# Altium footprint library Active.PcbLib: 325 footprints (part 1 of 23) (continued)
## BGA736-H3 [mm] "PBGA 736pin" (continued)
Top Overlay:
  circle w0.25: c-19.375,17.5 r0.125
  region: -17.75,18.75 -18.75,17.75 -18.75,18.75
  lines w0.15: -18.75,17.75 -17.75,18.75 ; -18.75,-18.75 -18.75,18.75 18.75,18.75 18.75,-18.75 -18.75,-18.75
Mechanical 13:
  circle w0.127: c0,0 r14
  circle w0.127: c-12.5,12.5 r0.75
  lines w0.1: -18.75,-18.75 -18.75,18.75 18.75,18.75 18.75,-18.75 -18.75,-18.75
  lines w0.102: -17.25,-13.25 -13.25,-17.25 13.25,-17.25 17.25,-13.25 17.25,13.25 13.25,17.25 -13.25,17.25 -17.25,13.25 -17.25,-13.25
Mechanical 15:
  lines w0.1: -0.5,0 0.5,0 ; 0,-0.5 0,0.5 ; -19.75,-19.75 -19.75,19.75 19.75,19.75 19.75,-19.75 -19.75,-19.75
3D body: height 2.42, standoff 2.42, extent -14,-14 14,14
3D body: height 1, standoff 0.4, extent -18.75,-18.75 18.75,18.75
3D body: height 2.42, standoff 1, extent -17.25,-17.25 17.25,17.25
3D body: height 2.42, standoff 2.42, extent -13.25,11.75 -11.75,13.25

## BRDBS [mil] "Bridge rectifier DBS"
height 125
pads (4):
  rect 60x100 smd: 1(-100,-170) 2(100,-170) 3(100,170) 4(-100,170)
Top Overlay:
  lines w4: 140,-105 140,105 ; 140,175 170,175 ; 155,160 155,190 ; -160,-105 160,-105 160,105 -160,105 -160,-105
Mechanical 13:
  lines w4: -120,-125 -120,-200 -80,-200 -80,-125 ; -120,125 -120,200 -80,200 -80,125 ; -117.56,95 -80,95 ; 80,-125 80,-200 120,-200 120,-125 ; 80,95.12 120,95.12 ; 80,125 80,200 120,200 120,125 ; 100,75 100,115 ; 140,-125 140,125 ; -160,-125 160,-125 160,125 -160,125 -160,-125
Mechanical 15:
  lines w4: -19.68,0 19.68,0 ; 0,-19.68 0,19.68
3D body: height 118.11, standoff 11.81, extent -160,-125 160,125
3D body: height 66.93, standoff 55.12, extent -120,125 -80,165
3D body: height 11.81, standoff 0, extent -120,150 -80,200
3D body: height 55.12, standoff 11.81, extent -120,150 -80,165
3D body: height 55.12, standoff 11.81, extent 80,150 120,165
3D body: height 11.81, standoff 0, extent 80,150 120,200
3D body: height 66.93, standoff 55.12, extent 80,125 120,165
3D body: height 55.12, standoff 11.81, extent 80,-165 120,-150
3D body: height 11.81, standoff 0, extent 80,-200 120,-150
3D body: height 66.93, standoff 55.12, extent 80,-165 120,-125
3D body: height 55.12, standoff 11.81, extent -120,-165 -80,-150
3D body: height 11.81, standoff 0, extent -120,-200 -80,-150
3D body: height 66.93, standoff 55.12, extent -120,-165 -80,-125

## BRTO269AA [mm] "Bridge rectifier MBS"
height 2
pads (4):
  rect 0.9x1.4 smd: 1(-1.27,-2.794) 2(1.27,-2.794) 3(1.27,2.794) 4(-1.27,2.794)
Top Overlay:
  lines w0.102: -2.4,-1.8 2.4,-1.8 2.4,1.8 -2.4,1.8 -2.4,-1.8
Mechanical 13:
  lines w0.102: -1.6,1.4 -0.9,1.4 ; 0.95,1.4 1.65,1.4 ; 1.3,1.05 1.3,1.75 ; -2.35,-2 2.35,-2 2.35,2 -2.35,2 -2.35,-2
Mechanical 15:
  lines w0.102: -0.5,0 0.5,0 ; 0,-0.5 0,0.5

## C8 [mm] "Voltage Variable Attenuator"
height 2.41
pads (9):
  rect 1.78x0.89 smd mask+0.04: 1(-3.43,1.905) 2(-3.43,0.635) 3(-3.43,-0.635) 4(-3.43,-1.905) 5(3.43,-1.905) 6(3.43,-0.635) 7(3.43,0.635) 8(3.43,1.905)
  rect 3.81x4.83 smd paste-5 mask-5: 9(0,0)
via 0,0 diameter 0.65 hole 0.3
via 1.27,1.778 diameter 0.65 hole 0.3
via -1.27,1.778 diameter 0.65 hole 0.3
via 0,1.778 diameter 0.65 hole 0.3
via -1.27,0 diameter 0.65 hole 0.3
via 1.27,0 diameter 0.65 hole 0.3
via 0,-1.778 diameter 0.65 hole 0.3
via -1.27,-1.778 diameter 0.65 hole 0.3
via 1.27,-1.778 diameter 0.65 hole 0.3
Top Overlay:
  circle w0.25: c-1.845,3.147 r0.125
Top Paste:
  region: -1.143,1.397 -0.889,1.651 -0.381,1.651 -0.127,1.397 -0.127,0.381 -0.381,0.127 -0.889,0.127 -1.143,0.381
  region: 1.143,1.397 0.889,1.651 0.381,1.651 0.127,1.397 0.127,0.381 0.381,0.127 0.889,0.127 1.143,0.381
  region: 1.143,-1.397 0.889,-1.651 0.381,-1.651 0.127,-1.397 0.127,-0.381 0.381,-0.127 0.889,-0.127 1.143,-0.381
  region: -1.143,-1.397 -0.889,-1.651 -0.381,-1.651 -0.127,-1.397 -0.127,-0.381 -0.381,-0.127 -0.889,-0.127 -1.143,-0.381
  region: -1.905,1.651 -1.651,1.651 -1.397,1.397 -1.397,0.381 -1.651,0.127 -1.905,0.127
  region: -1.905,-0.127 -1.651,-0.127 -1.397,-0.381 -1.397,-1.397 -1.651,-1.651 -1.905,-1.651
  region: 1.905,-0.127 1.651,-0.127 1.397,-0.381 1.397,-1.397 1.651,-1.651 1.905,-1.651
  region: 1.905,1.651 1.651,1.651 1.397,1.397 1.397,0.381 1.651,0.127 1.905,0.127
  region: -1.143,2.413 -1.143,2.159 -0.889,1.905 -0.381,1.905 -0.127,2.159 -0.127,2.413
  region: 1.143,2.413 1.143,2.159 0.889,1.905 0.381,1.905 0.127,2.159 0.127,2.413
  region: 1.143,-2.413 1.143,-2.159 0.889,-1.905 0.381,-1.905 0.127,-2.159 0.127,-2.413
  region: -1.143,-2.413 -1.143,-2.159 -0.889,-1.905 -0.381,-1.905 -0.127,-2.159 -0.127,-2.413
  region: -1.905,1.905 -1.651,1.905 -1.397,2.159 -1.397,2.413 -1.905,2.413
  region: 1.905,1.905 1.651,1.905 1.397,2.159 1.397,2.413 1.905,2.413
  region: 1.905,-1.905 1.651,-1.905 1.397,-2.159 1.397,-2.413 1.905,-2.413
  region: -1.905,-1.905 -1.651,-1.905 -1.397,-2.159 -1.397,-2.413 -1.905,-2.413
Top Solder:
  drawing of 16 lines, arcs and shapes, not listed
Mechanical 13:
  circle w0.127: c-1.496,2.121 r0.3
  lines w0.102: -2.16,-2.159 -3.937,-2.159 -3.937,-1.651 -2.16,-1.651 ; -2.16,-0.889 -3.937,-0.889 -3.937,-0.381 -2.16,-0.381 ; -2.16,0.381 -3.937,0.381 -3.937,0.889 -2.16,0.889 ; -2.16,1.651 -3.937,1.651 -3.937,2.159 -2.16,2.159 ; 2.16,-2.159 3.937,-2.159 3.937,-1.651 2.16,-1.651 ; 2.16,-0.889 3.937,-0.889 3.937,-0.381 2.16,-0.381 ; 2.16,0.381 3.937,0.381 3.937,0.889 2.16,0.889 ; 2.16,1.651 3.937,1.651 3.937,2.159 2.16,2.159 ; -2.16,-2.795 2.16,-2.795 2.16,2.795 -2.16,2.795 -2.16,-2.795
Mechanical 15:
  lines w0.1: -0.5,0 0.5,0 ; 0,-0.5 0,0.5 ; -4.572,-2.667 4.572,-2.667 4.572,2.667 -4.572,2.667 -4.572,-2.667
3D body: height 2.41, standoff 0, extent -2.16,-2.795 2.16,2.795
3D body: height 2.42, standoff 2.41, extent -1.778,1.397 -0.782,2.395
3D body: height 0.5, standoff 0, extent -3.937,1.651 -2.16,2.159
3D body: height 0.5, standoff 0, extent -3.937,0.381 -2.16,0.889
3D body: height 0.5, standoff 0, extent -3.937,-0.889 -2.16,-0.381
3D body: height 0.5, standoff 0, extent -3.937,-2.159 -2.16,-1.651
3D body: height 0.5, standoff 0, extent 2.16,-2.159 3.937,-1.651
3D body: height 0.5, standoff 0, extent 2.16,-0.889 3.937,-0.381
3D body: height 0.5, standoff 0, extent 2.16,0.381 3.937,0.889
3D body: height 0.5, standoff 0, extent 2.16,1.651 3.937,2.159

## CA05N-5 [mm]
height 12.7
pads (9):
  round 2.5 hole 1.2: 1(0,0) 2(19.05,-6.35) 3(22.86,-19.05) 4(26.67,-6.35) 5(33.02,-19.05) 6(33.02,-6.35) 7(33.02,0) 8(0,-19.05)
  round 0 hole 4.75: MH1(14.48,-5.59)
Mechanical 13:
  lines w0.127: -8.13,-22.86 -8.13,5.08 36.32,5.08 36.32,-22.86 -8.13,-22.86
3D body: height 12.7, standoff 0, extent -8.13,-22.86 36.32,5.08
3D body: height 12.71, standoff 12.7, extent -5.568,0.254 -3.576,2.25
3D body: height 0, standoff -5.08, extent -0.61,-0.61 0.586,0.588
3D body: height 0, standoff -5.08, extent -0.61,-19.66 0.586,-18.462
3D body: height 0, standoff -5.08, extent 22.25,-19.66 23.446,-18.462
3D body: height 0, standoff -5.08, extent 18.44,-6.96 19.636,-5.762
3D body: height 0, standoff -5.08, extent 32.41,-19.66 33.606,-18.462
3D body: height 0, standoff -5.08, extent 26.06,-6.96 27.256,-5.762
3D body: height 0, standoff -5.08, extent 32.41,-6.96 33.606,-5.762
3D body: height 0, standoff -5.08, extent 32.41,-0.61 33.606,0.588

## carrier [mm] "20 Leads; Body Width 8.9mm; Pitch 1.27 mm"
height 1.651
pads (20):
  rect 1.651x0.6 smd: 1(-4.025,2.54) 2(-4.025,1.27) 3(-4.025,0) 4(-4.025,-1.27) 5(-4.025,-2.54) 11(4.025,-2.54) 12(4.025,-1.27) 13(4.025,0) 14(4.025,1.27) 15(4.025,2.54)
  rect 0.6x1.651 smd: 6(-2.54,-4.025) 7(-1.27,-4.025) 8(0,-4.025) 9(1.27,-4.025) 10(2.54,-4.025) 16(2.54,4.025) 17(1.27,4.025) 18(0,4.025) 19(-1.27,4.025) 20(-2.54,4.025)
Top Overlay:
  circle w0.25: c-3.454,3.454 r0.125
Mechanical 13:
  circle w0.1: c-3.454,3.454 r0.5
  lines w0.1: -4.47,-4.343 -4.343,-4.47 4.343,-4.47 4.47,-4.343 4.47,4.343 4.343,4.47 -4.47,4.47 -4.47,-4.343
Mechanical 15:
  lines w0.1: -0.5,0 0.5,0 ; 0,-0.5 0,0.5 ; -5.07,-5.07 5.07,-5.07 5.07,5.07 -5.07,5.07 -5.07,-5.07
3D body: height 1.65, standoff 0, extent -4.445,-4.445 4.445,4.445

## CC1R5-F-E(DIP) [mm] "CC1R5-F-E, DIP 11pin, Body 16.51x16.6x8.5mm (LxWxH), R2.54mm"
height 8.5
pads (9):
  round 2 hole 1.1: 1(0,0) 2(0,-7.62) 3(0,-10.16) 4(16.51,-10.16) 5(16.51,-7.62) 6(16.51,-2.54) 7(16.51,0)
  round 2.5 hole 1.5: MH1(1.905,-13.08) MH2(14.605,2.92)
Mechanical 13:
  lines w0.127: 0,-13.08 0,2.92 16.51,2.92 16.51,-13.08 0,-13.08
3D body: height 8.51, standoff 8.5, extent 1.544,-1.016 3.536,0.98
3D body: height 3.5, standoff -3.5, extent 13.843,2.667 15.367,3.175
3D body: height 3.5, standoff -3.5, extent 16.256,-0.508 16.764,0.508
3D body: height 3.5, standoff -3.5, extent 16.256,-3.048 16.764,-2.032
3D body: height 3.5, standoff -3.5, extent 16.256,-8.128 16.764,-7.112
3D body: height 3.5, standoff -3.5, extent 16.256,-11.176 16.764,-10.16
3D body: height 3.5, standoff -3.5, extent 1.143,-13.334 2.667,-12.826
3D body: height 3.5, standoff -3.5, extent -0.254,-10.668 0.254,-9.652
3D body: height 3.5, standoff -3.5, extent -0.254,-8.128 0.254,-7.112
3D body: height 3.5, standoff -3.5, extent -0.254,-0.508 0.254,0.508
3D body: height 8.5, standoff 0, extent 0,-13.08 16.51,2.92

## CC3-F-E(DIP) [mm] "CC3-F-E, DIP 11pin, Body 22.86x16.6x8.5mm (LxWxH), R2.54mm"
height 8.5
pads (9):
  round 2 hole 1.1: 1(0,0) 2(0,-7.62) 3(0,-10.668) 6(22.86,-2.54) 7(22.86,0)
  round 2.2 hole 1.1: 4(22.86,-10.668) 5(22.86,-7.62)
  round 2.5 hole 1.5: MH1(2.54,-13.08) MH2(20.32,2.92)
Mechanical 13:
  lines w0.127: 0,-13.38 22.86,-13.38 22.86,3.22 0,3.22 0,-13.38
3D body: height 8.5, standoff 0, extent 0,-13.38 22.86,3.22
3D body: height 3.5, standoff -3.5, extent -0.254,-0.508 0.254,0.508
3D body: height 3.5, standoff -3.5, extent -0.254,-8.128 0.254,-7.112
3D body: height 3.5, standoff -3.5, extent -0.254,-11.176 0.254,-10.16
3D body: height 3.5, standoff -3.5, extent 1.778,-13.589 3.302,-13.081
3D body: height 3.5, standoff -3.5, extent 22.606,-11.176 23.114,-10.16
3D body: height 3.5, standoff -3.5, extent 22.606,-8.128 23.114,-7.112
3D body: height 3.5, standoff -3.5, extent 22.606,-3.048 23.114,-2.032
3D body: height 3.5, standoff -3.5, extent 22.606,-0.508 23.114,0.508
3D body: height 3.5, standoff -3.5, extent 19.558,2.667 21.082,3.175
3D body: height 8.51, standoff 8.5, extent 1.544,-1.016 3.536,0.98

## CC3-F-E(SMD) [mm] "CC3-F-E, DIP 11pin, Body 22.86x16.6x8.5mm (LxWxH), R2.54mm"
height 8.5
pads (7):
  rect 3.2x1.2 smd: 1(-1.17,0) 2(-1.17,-7.62) 3(-1.17,-10.16) 4(24.03,-10.16) 5(24.03,-7.62) 6(24.03,-2.54) 7(24.03,0)
Mechanical 13:
  lines w0.127: 0,-10.501 -1.791,-10.501 -1.791,-9.81 0,-9.81 ; 0,-7.961 -1.791,-7.961 -1.791,-7.27 0,-7.27 ; 0,-0.341 -1.791,-0.341 -1.791,0.35 0,0.35 ; 22.86,-10.501 24.651,-10.501 24.651,-9.81 22.86,-9.81 ; 22.86,-7.961 24.651,-7.961 24.651,-7.27 22.86,-7.27 ; 22.86,-2.881 24.651,-2.881 24.651,-2.19 22.86,-2.19 ; 22.86,-0.341 24.651,-0.341 24.651,0.35 22.86,0.35 ; 0,-13.38 22.86,-13.38 22.86,3.22 0,3.22 0,-13.38
3D body: height 8.5, standoff 0, extent 0,-13.38 22.86,3.22
3D body: height 8.51, standoff 8.5, extent 1.544,-1.016 3.536,0.98

## CC6-F-E(DIP) [mm] "CC6-F-E, DIP 11pin, Body 22.86x21.1x8.5mm (LxWxH), R5.08mm"
height 8.5
pads (9):
  round 2 hole 1.1: 1(0,0) 2(0,-10.16) 3(0,-15.24) 4(22.86,-15.24) 5(22.86,-10.16) 6(22.86,-5.08) 7(22.86,0)
  round 2.5 hole 1.5: MH1(2.54,2.63) MH2(20.32,-17.87)
Mechanical 13:
  lines w0.127: 0,-17.87 0,2.63 22.86,2.63 22.86,-17.87 0,-17.87
3D body: height 8.51, standoff 8.5, extent 1.544,-1.016 3.536,0.98
3D body: height 3.5, standoff -3.5, extent 19.558,-18.378 21.082,-17.87
3D body: height 3.5, standoff -3.5, extent 22.606,-0.508 23.114,0.508
3D body: height 3.5, standoff -3.5, extent 22.606,-5.588 23.114,-4.572
3D body: height 3.5, standoff -3.5, extent 22.606,-10.668 23.114,-9.652
3D body: height 3.5, standoff -3.5, extent 22.606,-15.748 23.114,-14.732
3D body: height 3.5, standoff -3.5, extent 1.778,2.63 3.302,3.138
3D body: height 3.5, standoff -3.5, extent -0.254,-10.668 0.254,-9.652
3D body: height 3.5, standoff -3.5, extent -0.254,-15.748 0.254,-14.732
3D body: height 3.5, standoff -3.5, extent -0.254,-0.508 0.254,0.508
3D body: height 8.5, standoff 0, extent 0,-17.87 22.86,2.63

## CC6-F-E(SMD) [mm] "CC6-F-E, DIP 11pin, Body 22.86x21.1x8.5mm (LxWxH), R5.08mm"
height 8.5
pads (7):
  rect 3.2x1.2 smd: 1(-1.17,0) 2(-1.17,-10.16) 3(-1.17,-15.24) 4(24.03,-15.24) 5(24.03,-10.16) 6(24.03,-5.08) 7(24.03,0)
Mechanical 13:
  lines w0.127: 0,-15.581 -1.791,-15.581 -1.791,-14.89 0,-14.89 ; 0,-10.501 -1.791,-10.501 -1.791,-9.81 0,-9.81 ; 0,-0.341 -1.791,-0.341 -1.791,0.35 0,0.35 ; 22.86,-15.581 24.651,-15.581 24.651,-14.89 22.86,-14.89 ; 22.86,-10.501 24.651,-10.501 24.651,-9.81 22.86,-9.81 ; 22.86,-5.421 24.651,-5.421 24.651,-4.73 22.86,-4.73 ; 22.86,-0.341 24.651,-0.341 24.651,0.35 22.86,0.35 ; 0,-17.87 0,2.63 22.86,2.63 22.86,-17.87 0,-17.87
3D body: height 8.51, standoff 8.5, extent 1.544,-1.016 3.536,0.98
3D body: height 8.5, standoff 0, extent 0,-17.87 22.86,2.63

## CC10-F-E(DIP) [mm] "CC3-F-E, DIP 11pin, Body 35.56x22.6x8.5mm (LxWxH), R5.08mm"
height 8.5
pads (9):
  round 2 hole 1.1: 1(0,0) 2(0,-10.16) 3(0,-15.24) 6(35.56,-5.08) 7(35.56,0)
  round 2.2 hole 1.1: 4(35.56,-15.24) 5(35.56,-10.16)
  round 2.5 hole 1.5: MH1(5.08,3.38) MH2(30.48,-18.64)
Mechanical 13:
  lines w0.127: 0,-18.64 35.56,-18.64 ; 0,-18.62 0,3.38 35.56,3.38 35.56,-18.62
3D body: height 8.5, standoff 0, extent 0,-18.64 35.56,3.38
3D body: height 3.5, standoff -3.5, extent -0.254,-0.508 0.254,0.508
3D body: height 3.5, standoff -3.5, extent -0.254,-10.668 0.254,-9.652
3D body: height 3.5, standoff -3.5, extent -0.254,-15.748 0.254,-14.732
3D body: height 3.5, standoff -3.5, extent 4.318,3.38 5.842,3.888
3D body: height 3.5, standoff -3.5, extent 35.56,-15.748 36.068,-14.732
3D body: height 3.5, standoff -3.5, extent 35.56,-10.668 36.068,-9.652
3D body: height 3.5, standoff -3.5, extent 35.56,-5.639 36.068,-4.623
3D body: height 3.5, standoff -3.5, extent 35.56,-0.533 36.068,0.483
3D body: height 3.5, standoff -3.5, extent 29.743,-19.148 31.267,-18.64
3D body: height 8.51, standoff 8.5, extent 1.544,-1.016 3.536,0.98